# Altium schematic symbol library jlcpcb_2025_04_capacitors_extended_0603.schlib: 3668 symbols (part 1 of 20) (continued)
## 0603B201K500NT
designator C?  Capacitance: 200pF  (hidden comment: *)
Capacitor, Ceramic (MLCC), 200pF, ±10%, 50V, X7R, ±10%, SMD 0603; Manufacturer: FH(Guangdong Fenghua Advanced Tech); Manufacturer Part Number: 0603B201K500NT; Package Size: 0603; JLCPCB Basic Part: No; JLCPCB Part Number: C1600; Supplier 1: LCSC; Category: Capacitors - MLCC; Supplier Part Number 1: C1600; Tolerance: ±10%; Voltage Rating: 50V; Temperature Coefficient: X7R; RoHS: Yes; ComponentLink1Description: Datasheet; ComponentLink1URL: https://wmsc.lcsc.com/wmsc/upload/file/pdf/v2/lcsc/2304140030_FH--Guangdong-Fenghua-Advanced-Tech-0603B201K500NT_C1600.pdf; ComponentLink2Description: JLCPCB Part URL; ComponentLink2URL: https://jlcpcb.com/partdetail/C1600; ComponentLink3Description: LCSC Part URL; ComponentLink3URL: https://lcsc.com/product-detail/Multilayer-Ceramic-Capacitors-MLCC---SMD-SMT_FH-Guangdong-Fenghua-Advanced-Tech-FH-Guangdong-Fenghua-Advanced-Tech-0603B201K500NT_C1600.html
footprint CAP-0603 (0603 (1608M) Capacitor)
pins: 1, 2

## 0603B202K500CT
designator C?  Capacitance: 2nF  (hidden comment: *)
Capacitor, Ceramic (MLCC), 2nF, ±10%, 50V, X7R, ±10%, SMD 0603; Manufacturer: Walsin Tech Corp; Manufacturer Part Number: 0603B202K500CT; Package Size: 0603; JLCPCB Basic Part: No; JLCPCB Part Number: C123505; Supplier 1: LCSC; Category: Capacitors - MLCC; Supplier Part Number 1: C123505; Tolerance: ±10%; Voltage Rating: 50V; Temperature Coefficient: X7R; RoHS: Yes; ComponentLink1Description: Datasheet; ComponentLink1URL: https://wmsc.lcsc.com/wmsc/upload/file/pdf/v2/lcsc/2304140030_Walsin-Tech-Corp-0603B202K500CT_C123505.pdf; ComponentLink2Description: JLCPCB Part URL; ComponentLink2URL: https://jlcpcb.com/partdetail/C123505; ComponentLink3Description: LCSC Part URL; ComponentLink3URL: https://lcsc.com/product-detail/Multilayer-Ceramic-Capacitors-MLCC---SMD-SMT_Walsin-Tech-Corp-Walsin-Tech-Corp-0603B202K500CT_C123505.html
footprint CAP-0603 (0603 (1608M) Capacitor)
pins: 1, 2

## 0603B202K500NT
designator C?  Capacitance: 2nF  (hidden comment: *)
Capacitor, Ceramic (MLCC), 2nF, ±10%, 50V, X7R, ±10%, SMD 0603; Manufacturer: FH(Guangdong Fenghua Advanced Tech); Manufacturer Part Number: 0603B202K500NT; Package Size: 0603; JLCPCB Basic Part: No; JLCPCB Part Number: C1601; Supplier 1: LCSC; Category: Capacitors - MLCC; Supplier Part Number 1: C1601; Tolerance: ±10%; Voltage Rating: 50V; Temperature Coefficient: X7R; RoHS: Yes; ComponentLink1Description: Datasheet; ComponentLink1URL: https://wmsc.lcsc.com/wmsc/upload/file/pdf/v2/lcsc/2304140030_FH--Guangdong-Fenghua-Advanced-Tech-0603B202K500NT_C1601.pdf; ComponentLink2Description: JLCPCB Part URL; ComponentLink2URL: https://jlcpcb.com/partdetail/C1601; ComponentLink3Description: LCSC Part URL; ComponentLink3URL: https://lcsc.com/product-detail/Multilayer-Ceramic-Capacitors-MLCC---SMD-SMT_FH-Guangdong-Fenghua-Advanced-Tech-FH-Guangdong-Fenghua-Advanced-Tech-0603B202K500NT_C1601.html
footprint CAP-0603 (0603 (1608M) Capacitor)
pins: 1, 2

## 0603B203K500CT
designator C?  Capacitance: 20nF  (hidden comment: *)
Capacitor, Ceramic (MLCC), 20nF, ±10%, 50V, X7R, ±10%, SMD 0603; Manufacturer: Walsin Tech Corp; Manufacturer Part Number: 0603B203K500CT; Package Size: 0603; JLCPCB Basic Part: No; JLCPCB Part Number: C296019; Supplier 1: LCSC; Category: Capacitors - MLCC; Supplier Part Number 1: C296019; Tolerance: ±10%; Voltage Rating: 50V; Temperature Coefficient: X7R; RoHS: Yes; ComponentLink1Description: Datasheet; ComponentLink1URL: https://wmsc.lcsc.com/wmsc/upload/file/pdf/v2/lcsc/2304140030_Walsin-Tech-Corp-0603B203K500CT_C296019.pdf; ComponentLink2Description: JLCPCB Part URL; ComponentLink2URL: https://jlcpcb.com/partdetail/C296019; ComponentLink3Description: LCSC Part URL; ComponentLink3URL: https://lcsc.com/product-detail/Multilayer-Ceramic-Capacitors-MLCC---SMD-SMT_Walsin-Tech-Corp-Walsin-Tech-Corp-0603B203K500CT_C296019.html
footprint CAP-0603 (0603 (1608M) Capacitor)
pins: 1, 2

## 0603B203K500NT
designator C?  Capacitance: 20nF  (hidden comment: *)
Capacitor, Ceramic (MLCC), 20nF, ±10%, 50V, X7R, ±10%, SMD 0603; Manufacturer: FH(Guangdong Fenghua Advanced Tech); Manufacturer Part Number: 0603B203K500NT; Package Size: 0603; JLCPCB Basic Part: No; JLCPCB Part Number: C1602; Supplier 1: LCSC; Category: Capacitors - MLCC; Supplier Part Number 1: C1602; Tolerance: ±10%; Voltage Rating: 50V; Temperature Coefficient: X7R; RoHS: Yes; ComponentLink1Description: Datasheet; ComponentLink1URL: https://wmsc.lcsc.com/wmsc/upload/file/pdf/v2/lcsc/2304140030_FH--Guangdong-Fenghua-Advanced-Tech-0603B203K500NT_C1602.pdf; ComponentLink2Description: JLCPCB Part URL; ComponentLink2URL: https://jlcpcb.com/partdetail/C1602; ComponentLink3Description: LCSC Part URL; ComponentLink3URL: https://lcsc.com/product-detail/Multilayer-Ceramic-Capacitors-MLCC---SMD-SMT_FH-Guangdong-Fenghua-Advanced-Tech-FH-Guangdong-Fenghua-Advanced-Tech-0603B203K500NT_C1602.html
footprint CAP-0603 (0603 (1608M) Capacitor)
pins: 1, 2

## 0603B221J500CT
designator C?  Capacitance: 220pF  (hidden comment: *)
Capacitor, Ceramic (MLCC), 220pF, ±5%, 50V, X7R, ±5%, SMD 0603; Manufacturer: Walsin Tech Corp; Manufacturer Part Number: 0603B221J500CT; Package Size: 0603; JLCPCB Basic Part: No; JLCPCB Part Number: C525500; Supplier 1: LCSC; Category: Capacitors - MLCC; Supplier Part Number 1: C525500; Tolerance: ±5%; Voltage Rating: 50V; Temperature Coefficient: X7R; RoHS: Yes; ComponentLink1Description: Datasheet; ComponentLink1URL: https://wmsc.lcsc.com/wmsc/upload/file/pdf/v2/lcsc/2304140030_Walsin-Tech-Corp-0603B221J500CT_C525500.pdf; ComponentLink2Description: JLCPCB Part URL; ComponentLink2URL: https://jlcpcb.com/partdetail/C525500; ComponentLink3Description: LCSC Part URL; ComponentLink3URL: https://lcsc.com/product-detail/Multilayer-Ceramic-Capacitors-MLCC---SMD-SMT_Walsin-Tech-Corp-Walsin-Tech-Corp-0603B221J500CT_C525500.html
footprint CAP-0603 (0603 (1608M) Capacitor)
pins: 1, 2

## 0603B221K101NT
designator C?  Capacitance: 220pF  (hidden comment: *)
Capacitor, Ceramic (MLCC), 220pF, ±10%, 100V, X7R, ±10%, SMD 0603; Manufacturer: FH(Guangdong Fenghua Advanced Tech); Manufacturer Part Number: 0603B221K101NT; Package Size: 0603; JLCPCB Basic Part: No; JLCPCB Part Number: C313082; Supplier 1: LCSC; Category: Capacitors - MLCC; Supplier Part Number 1: C313082; Tolerance: ±10%; Voltage Rating: 100V; Temperature Coefficient: X7R; RoHS: Yes; ComponentLink1Description: Datasheet; ComponentLink1URL: https://wmsc.lcsc.com/wmsc/upload/file/pdf/v2/lcsc/2304140030_FH--Guangdong-Fenghua-Advanced-Tech-0603B221K101NT_C313082.pdf; ComponentLink2Description: JLCPCB Part URL; ComponentLink2URL: https://jlcpcb.com/partdetail/C313082; ComponentLink3Description: LCSC Part URL; ComponentLink3URL: https://lcsc.com/product-detail/Multilayer-Ceramic-Capacitors-MLCC---SMD-SMT_FH-Guangdong-Fenghua-Advanced-Tech-FH-Guangdong-Fenghua-Advanced-Tech-0603B221K101NT_C313082.html
footprint CAP-0603 (0603 (1608M) Capacitor)
pins: 1, 2

## 0603B221K201CT
designator C?  Capacitance: 220pF  (hidden comment: *)
Capacitor, Ceramic (MLCC), 220pF, ±10%, 200V, X7R, ±10%, SMD 0603; Manufacturer: Walsin Tech Corp; Manufacturer Part Number: 0603B221K201CT; Package Size: 0603; JLCPCB Basic Part: No; JLCPCB Part Number: C396708; Supplier 1: LCSC; Category: Capacitors - MLCC; Supplier Part Number 1: C396708; Tolerance: ±10%; Voltage Rating: 200V; Temperature Coefficient: X7R; RoHS: Yes; ComponentLink1Description: Datasheet; ComponentLink1URL: https://wmsc.lcsc.com/wmsc/upload/file/pdf/v2/lcsc/2304140030_Walsin-Tech-Corp-0603B221K201CT_C396708.pdf; ComponentLink2Description: JLCPCB Part URL; ComponentLink2URL: https://jlcpcb.com/partdetail/C396708; ComponentLink3Description: LCSC Part URL; ComponentLink3URL: https://lcsc.com/product-detail/Multilayer-Ceramic-Capacitors-MLCC---SMD-SMT_Walsin-Tech-Corp-Walsin-Tech-Corp-0603B221K201CT_C396708.html
footprint CAP-0603 (0603 (1608M) Capacitor)
pins: 1, 2

## 0603B221K201NT
designator C?  Capacitance: 220pF  (hidden comment: *)
Capacitor, Ceramic (MLCC), 220pF, ±10%, 200V, X7R, ±10%, SMD 0603; Manufacturer: FH(Guangdong Fenghua Advanced Tech); Manufacturer Part Number: 0603B221K201NT; Package Size: 0603; JLCPCB Basic Part: No; JLCPCB Part Number: C575440; Supplier 1: LCSC; Category: Capacitors - MLCC; Supplier Part Number 1: C575440; Tolerance: ±10%; Voltage Rating: 200V; Temperature Coefficient: X7R; RoHS: Yes; ComponentLink1Description: Datasheet; ComponentLink1URL: https://wmsc.lcsc.com/wmsc/upload/file/pdf/v2/lcsc/2304140030_FH--Guangdong-Fenghua-Advanced-Tech-0603B221K201NT_C575440.pdf; ComponentLink2Description: JLCPCB Part URL; ComponentLink2URL: https://jlcpcb.com/partdetail/C575440; ComponentLink3Description: LCSC Part URL; ComponentLink3URL: https://lcsc.com/product-detail/Multilayer-Ceramic-Capacitors-MLCC---SMD-SMT_FH-Guangdong-Fenghua-Advanced-Tech-FH-Guangdong-Fenghua-Advanced-Tech-0603B221K201NT_C575440.html
footprint CAP-0603 (0603 (1608M) Capacitor)
pins: 1, 2

## 0603B221K251CT
designator C?  Capacitance: 220pF  (hidden comment: *)
Capacitor, Ceramic (MLCC), 220pF, ±10%, 250V, X7R, ±10%, SMD 0603; Manufacturer: Walsin Tech Corp; Manufacturer Part Number: 0603B221K251CT; Package Size: 0603; JLCPCB Basic Part: No; JLCPCB Part Number: C2962048; Supplier 1: LCSC; Category: Capacitors - MLCC; Supplier Part Number 1: C2962048; Tolerance: ±10%; Voltage Rating: 250V; Temperature Coefficient: X7R; RoHS: Yes; ComponentLink1Description: Datasheet; ComponentLink1URL: https://wmsc.lcsc.com/wmsc/upload/file/pdf/v2/lcsc/2201181800_Walsin-Tech-Corp-0603B221K251CT_C2962048.pdf; ComponentLink2Description: JLCPCB Part URL; ComponentLink2URL: https://jlcpcb.com/partdetail/C2962048; ComponentLink3Description: LCSC Part URL; ComponentLink3URL: https://lcsc.com/product-detail/Multilayer-Ceramic-Capacitors-MLCC---SMD-SMT_Walsin-Tech-Corp-Walsin-Tech-Corp-0603B221K251CT_C2962048.html
footprint CAP-0603 (0603 (1608M) Capacitor)
pins: 1, 2

## 0603B221K251NT
designator C?  Capacitance: 220pF  (hidden comment: *)
Capacitor, Ceramic (MLCC), 220pF, ±10%, 250V, X7R, ±10%, SMD 0603; Manufacturer: FH (Guangdong Fenghua Advanced Tech); Manufacturer Part Number: 0603B221K251NT; Package Size: 0603; JLCPCB Basic Part: No; JLCPCB Part Number: C5350801; Supplier 1: LCSC; Category: Capacitors - MLCC; Supplier Part Number 1: C5350801; Tolerance: ±10%; Voltage Rating: 250V; Temperature Coefficient: X7R; RoHS: Yes; ComponentLink1Description: Datasheet; ComponentLink1URL: https://wmsc.lcsc.com/wmsc/upload/file/pdf/v2/lcsc/2301131609_FH--Guangdong-Fenghua-Advanced-Tech-0603B221K251NT_C5350801.pdf; ComponentLink2Description: JLCPCB Part URL; ComponentLink2URL: https://jlcpcb.com/partdetail/C5350801; ComponentLink3Description: LCSC Part URL; ComponentLink3URL: https://lcsc.com/product-detail/Multilayer-Ceramic-Capacitors-MLCC---SMD-SMT_FH-Guangdong-Fenghua-Advanced-Tech-FH-Guangdong-Fenghua-Advanced-Tech-0603B221K251NT_C5350801.html
footprint CAP-0603 (0603 (1608M) Capacitor)
pins: 1, 2

## 0603B221K500CT
designator C?  Capacitance: 220pF  (hidden comment: *)
Capacitor, Ceramic (MLCC), 220pF, ±10%, 50V, X7R, ±10%, SMD 0603; Manufacturer: Walsin Tech Corp; Manufacturer Part Number: 0603B221K500CT; Package Size: 0603; JLCPCB Basic Part: No; JLCPCB Part Number: C123506; Supplier 1: LCSC; Category: Capacitors - MLCC; Supplier Part Number 1: C123506; Tolerance: ±10%; Voltage Rating: 50V; Temperature Coefficient: X7R; RoHS: Yes; ComponentLink1Description: Datasheet; ComponentLink1URL: https://wmsc.lcsc.com/wmsc/upload/file/pdf/v2/lcsc/2304140030_Walsin-Tech-Corp-0603B221K500CT_C123506.pdf; ComponentLink2Description: JLCPCB Part URL; ComponentLink2URL: https://jlcpcb.com/partdetail/C123506; ComponentLink3Description: LCSC Part URL; ComponentLink3URL: https://lcsc.com/product-detail/Multilayer-Ceramic-Capacitors-MLCC---SMD-SMT_Walsin-Tech-Corp-Walsin-Tech-Corp-0603B221K500CT_C123506.html
footprint CAP-0603 (0603 (1608M) Capacitor)
pins: 1, 2

## 0603B221K500NT
designator C?  Capacitance: 220pF  (hidden comment: *)
Capacitor, Ceramic (MLCC), 220pF, ±10%, 50V, X7R, ±10%, SMD 0603; Manufacturer: FH(Guangdong Fenghua Advanced Tech); Manufacturer Part Number: 0603B221K500NT; Package Size: 0603; JLCPCB Basic Part: No; JLCPCB Part Number: C36259; Supplier 1: LCSC; Category: Capacitors - MLCC; Supplier Part Number 1: C36259; Tolerance: ±10%; Voltage Rating: 50V; Temperature Coefficient: X7R; RoHS: Yes; ComponentLink1Description: Datasheet; ComponentLink1URL: https://wmsc.lcsc.com/wmsc/upload/file/pdf/v2/lcsc/2304140030_FH--Guangdong-Fenghua-Advanced-Tech-0603B221K500NT_C36259.pdf; ComponentLink2Description: JLCPCB Part URL; ComponentLink2URL: https://jlcpcb.com/partdetail/C36259; ComponentLink3Description: LCSC Part URL; ComponentLink3URL: https://lcsc.com/product-detail/Multilayer-Ceramic-Capacitors-MLCC---SMD-SMT_FH-Guangdong-Fenghua-Advanced-Tech-FH-Guangdong-Fenghua-Advanced-Tech-0603B221K500NT_C36259.html
footprint CAP-0603 (0603 (1608M) Capacitor)
pins: 1, 2

## 0603B221M101CT
designator C?  Capacitance: 220pF  (hidden comment: *)
Capacitor, Ceramic (MLCC), 220pF, ±20%, 100V, X7R, ±20%, SMD 0603; Manufacturer: Walsin Tech Corp; Manufacturer Part Number: 0603B221M101CT; Package Size: 0603; JLCPCB Basic Part: No; JLCPCB Part Number: C384787; Supplier 1: LCSC; Category: Capacitors - MLCC; Supplier Part Number 1: C384787; Tolerance: ±20%; Voltage Rating: 100V; Temperature Coefficient: X7R; RoHS: Yes; ComponentLink1Description: Datasheet; ComponentLink1URL: https://wmsc.lcsc.com/wmsc/upload/file/pdf/v2/lcsc/2304140030_Walsin-Tech-Corp-0603B221M101CT_C384787.pdf; ComponentLink2Description: JLCPCB Part URL; ComponentLink2URL: https://jlcpcb.com/partdetail/C384787; ComponentLink3Description: LCSC Part URL; ComponentLink3URL: https://lcsc.com/product-detail/Multilayer-Ceramic-Capacitors-MLCC---SMD-SMT_Walsin-Tech-Corp-Walsin-Tech-Corp-0603B221M101CT_C384787.html
footprint CAP-0603 (0603 (1608M) Capacitor)
pins: 1, 2

## 0603B222J250CT
designator C?  Capacitance: 2.2nF  (hidden comment: *)
Capacitor, Ceramic (MLCC), 2.2nF, ±5%, 25V, X7R, ±5%, SMD 0603; Manufacturer: Walsin Tech Corp; Manufacturer Part Number: 0603B222J250CT; Package Size: 0603; JLCPCB Basic Part: No; JLCPCB Part Number: C388008; Supplier 1: LCSC; Category: Capacitors - MLCC; Supplier Part Number 1: C388008; Tolerance: ±5%; Voltage Rating: 25V; Temperature Coefficient: X7R; RoHS: Yes; ComponentLink1Description: Datasheet; ComponentLink1URL: https://wmsc.lcsc.com/wmsc/upload/file/pdf/v2/lcsc/2304140030_Walsin-Tech-Corp-0603B222J250CT_C388008.pdf; ComponentLink2Description: JLCPCB Part URL; ComponentLink2URL: https://jlcpcb.com/partdetail/C388008; ComponentLink3Description: LCSC Part URL; ComponentLink3URL: https://lcsc.com/product-detail/Multilayer-Ceramic-Capacitors-MLCC---SMD-SMT_Walsin-Tech-Corp-Walsin-Tech-Corp-0603B222J250CT_C388008.html
footprint CAP-0603 (0603 (1608M) Capacitor)
pins: 1, 2

## 0603B222J500CT
designator C?  Capacitance: 2.2nF  (hidden comment: *)
Capacitor, Ceramic (MLCC), 2.2nF, ±5%, 50V, X7R, ±5%, SMD 0603; Manufacturer: Walsin Tech Corp; Manufacturer Part Number: 0603B222J500CT; Package Size: 0603; JLCPCB Basic Part: No; JLCPCB Part Number: C296020; Supplier 1: LCSC; Category: Capacitors - MLCC; Supplier Part Number 1: C296020; Tolerance: ±5%; Voltage Rating: 50V; Temperature Coefficient: X7R; RoHS: Yes; ComponentLink1Description: Datasheet; ComponentLink1URL: https://wmsc.lcsc.com/wmsc/upload/file/pdf/v2/lcsc/2304140030_Walsin-Tech-Corp-0603B222J500CT_C296020.pdf; ComponentLink2Description: JLCPCB Part URL; ComponentLink2URL: https://jlcpcb.com/partdetail/C296020; ComponentLink3Description: LCSC Part URL; ComponentLink3URL: https://lcsc.com/product-detail/Multilayer-Ceramic-Capacitors-MLCC---SMD-SMT_Walsin-Tech-Corp-Walsin-Tech-Corp-0603B222J500CT_C296020.html
footprint CAP-0603 (0603 (1608M) Capacitor)
pins: 1, 2

## 0603B222J500NT
designator C?  Capacitance: 2.2nF  (hidden comment: *)
Capacitor, Ceramic (MLCC), 2.2nF, ±5%, 50V, X7R, ±5%, SMD 0603; Manufacturer: FH(Guangdong Fenghua Advanced Tech); Manufacturer Part Number: 0603B222J500NT; Package Size: 0603; JLCPCB Basic Part: No; JLCPCB Part Number: C60328; Supplier 1: LCSC; Category: Capacitors - MLCC; Supplier Part Number 1: C60328; Tolerance: ±5%; Voltage Rating: 50V; Temperature Coefficient: X7R; RoHS: Yes; ComponentLink1Description: Datasheet; ComponentLink1URL: https://wmsc.lcsc.com/wmsc/upload/file/pdf/v2/lcsc/2304140030_FH--Guangdong-Fenghua-Advanced-Tech-0603B222J500NT_C60328.pdf; ComponentLink2Description: JLCPCB Part URL; ComponentLink2URL: https://jlcpcb.com/partdetail/C60328; ComponentLink3Description: LCSC Part URL; ComponentLink3URL: https://lcsc.com/product-detail/Multilayer-Ceramic-Capacitors-MLCC---SMD-SMT_FH-Guangdong-Fenghua-Advanced-Tech-FH-Guangdong-Fenghua-Advanced-Tech-0603B222J500NT_C60328.html
footprint CAP-0603 (0603 (1608M) Capacitor)
pins: 1, 2

## 0603B222K101CT
designator C?  Capacitance: 2.2nF  (hidden comment: *)
Capacitor, Ceramic (MLCC), 2.2nF, ±10%, 100V, X7R, ±10%, SMD 0603; Manufacturer: Walsin Tech Corp; Manufacturer Part Number: 0603B222K101CT; Package Size: 0603; JLCPCB Basic Part: No; JLCPCB Part Number: C302019; Supplier 1: LCSC; Category: Capacitors - MLCC; Supplier Part Number 1: C302019; Tolerance: ±10%; Voltage Rating: 100V; Temperature Coefficient: X7R; RoHS: Yes; ComponentLink1Description: Datasheet; ComponentLink1URL: https://wmsc.lcsc.com/wmsc/upload/file/pdf/v2/lcsc/2304140030_Walsin-Tech-Corp-0603B222K101CT_C302019.pdf; ComponentLink2Description: JLCPCB Part URL; ComponentLink2URL: https://jlcpcb.com/partdetail/C302019; ComponentLink3Description: LCSC Part URL; ComponentLink3URL: https://lcsc.com/product-detail/Multilayer-Ceramic-Capacitors-MLCC---SMD-SMT_Walsin-Tech-Corp-Walsin-Tech-Corp-0603B222K101CT_C302019.html
footprint CAP-0603 (0603 (1608M) Capacitor)
pins: 1, 2

## 0603B222K101NT
designator C?  Capacitance: 2200pF  (hidden comment: *)
Capacitor, Ceramic (MLCC), 2200pF, ±10%, 100V, X7R, ±10%, SMD 0603; Manufacturer: FH (Guangdong Fenghua Advanced Tech); Manufacturer Part Number: 0603B222K101NT; Package Size: 0603; JLCPCB Basic Part: No; JLCPCB Part Number: C913915; Supplier 1: LCSC; Category: Capacitors - MLCC; Supplier Part Number 1: C913915; Tolerance: ±10%; Voltage Rating: 100V; Temperature Coefficient: X7R; RoHS: Yes; ComponentLink1Description: Datasheet; ComponentLink1URL: https://wmsc.lcsc.com/wmsc/upload/file/pdf/v2/lcsc/2304140030_FH--Guangdong-Fenghua-Advanced-Tech-0603B222K101NT_C913915.pdf; ComponentLink2Description: JLCPCB Part URL; ComponentLink2URL: https://jlcpcb.com/partdetail/C913915; ComponentLink3Description: LCSC Part URL; ComponentLink3URL: https://lcsc.com/product-detail/Multilayer-Ceramic-Capacitors-MLCC---SMD-SMT_FH-Guangdong-Fenghua-Advanced-Tech-FH-Guangdong-Fenghua-Advanced-Tech-0603B222K101NT_C913915.html
footprint CAP-0603 (0603 (1608M) Capacitor)
pins: 1, 2

## 0603B222K250NT
designator C?  Capacitance: 2.2nF  (hidden comment: *)
Capacitor, Ceramic (MLCC), 2.2nF, ±10%, 25V, X7R, ±10%, SMD 0603; Manufacturer: FH (Guangdong Fenghua Advanced Tech); Manufacturer Part Number: 0603B222K250NT; Package Size: 0603; JLCPCB Basic Part: No; JLCPCB Part Number: C2971754; Supplier 1: LCSC; Category: Capacitors - MLCC; Supplier Part Number 1: C2971754; Tolerance: ±10%; Voltage Rating: 25V; Temperature Coefficient: X7R; RoHS: Yes; ComponentLink1Description: Datasheet; ComponentLink1URL: https://wmsc.lcsc.com/wmsc/upload/file/pdf/v2/lcsc/2201241400_FH--Guangdong-Fenghua-Advanced-Tech-0603B222K250NT_C2971754.pdf; ComponentLink2Description: JLCPCB Part URL; ComponentLink2URL: https://jlcpcb.com/partdetail/C2971754; ComponentLink3Description: LCSC Part URL; ComponentLink3URL: https://lcsc.com/product-detail/Multilayer-Ceramic-Capacitors-MLCC---SMD-SMT_FH-Guangdong-Fenghua-Advanced-Tech-FH-Guangdong-Fenghua-Advanced-Tech-0603B222K250NT_C2971754.html
footprint CAP-0603 (0603 (1608M) Capacitor)
pins: 1, 2

## 0603B222K500CT
designator C?  Capacitance: 2.2nF  (hidden comment: *)
Capacitor, Ceramic (MLCC), 2.2nF, ±10%, 50V, X7R, ±10%, SMD 0603; Manufacturer: Walsin Tech Corp; Manufacturer Part Number: 0603B222K500CT; Package Size: 0603; JLCPCB Basic Part: No; JLCPCB Part Number: C93190; Supplier 1: LCSC; Category: Capacitors - MLCC; Supplier Part Number 1: C93190; Tolerance: ±10%; Voltage Rating: 50V; Temperature Coefficient: X7R; RoHS: Yes; ComponentLink1Description: Datasheet; ComponentLink1URL: https://wmsc.lcsc.com/wmsc/upload/file/pdf/v2/lcsc/2304140030_Walsin-Tech-Corp-0603B222K500CT_C93190.pdf; ComponentLink2Description: JLCPCB Part URL; ComponentLink2URL: https://jlcpcb.com/partdetail/C93190; ComponentLink3Description: LCSC Part URL; ComponentLink3URL: https://lcsc.com/product-detail/Multilayer-Ceramic-Capacitors-MLCC---SMD-SMT_Walsin-Tech-Corp-Walsin-Tech-Corp-0603B222K500CT_C93190.html
footprint CAP-0603 (0603 (1608M) Capacitor)
pins: 1, 2

## 0603B222K500CT-C
designator C?  Capacitance: 2.2nF  (hidden comment: *)
Capacitor, Ceramic (MLCC), 2.2nF, 50V, X7R, SMD 0603; Manufacturer: Walsin Tech Corp; Manufacturer Part Number: 0603B222K500CT-C; Package Size: 0603; JLCPCB Basic Part: No; JLCPCB Part Number: C2991477; Supplier 1: LCSC; Category: Capacitors - MLCC; Supplier Part Number 1: C2991477; Voltage Rating: 50V; Temperature Coefficient: X7R; RoHS: Yes; ComponentLink1Description: Datasheet; ComponentLink1URL: https://wmsc.lcsc.com/wmsc/upload/file/pdf/v2/lcsc/2204131745_Walsin-Tech-Corp-0603B222K500CT-C_C2991477.pdf; ComponentLink2Description: JLCPCB Part URL; ComponentLink2URL: https://jlcpcb.com/partdetail/C2991477; ComponentLink3Description: LCSC Part URL; ComponentLink3URL: https://lcsc.com/product-detail/Multilayer-Ceramic-Capacitors-MLCC---SMD-SMT_Walsin-Tech-Corp-Walsin-Tech-Corp-0603B222K500CT-C_C2991477.html
footprint CAP-0603 (0603 (1608M) Capacitor)
pins: 1, 2

## 0603B223J250NT
designator C?  Capacitance: 22nF  (hidden comment: *)
Capacitor, Ceramic (MLCC), 22nF, ±5%, 25V, X7R, ±5%, SMD 0603; Manufacturer: FH (Guangdong Fenghua Advanced Tech); Manufacturer Part Number: 0603B223J250NT; Package Size: 0603; JLCPCB Basic Part: No; JLCPCB Part Number: C302020; Supplier 1: LCSC; Category: Capacitors - MLCC; Supplier Part Number 1: C302020; Tolerance: ±5%; Voltage Rating: 25V; Temperature Coefficient: X7R; RoHS: Yes; ComponentLink1Description: Datasheet; ComponentLink1URL: https://wmsc.lcsc.com/wmsc/upload/file/pdf/v2/lcsc/2304140030_FH--Guangdong-Fenghua-Advanced-Tech-0603B223J250NT_C302020.pdf; ComponentLink2Description: JLCPCB Part URL; ComponentLink2URL: https://jlcpcb.com/partdetail/C302020; ComponentLink3Description: LCSC Part URL; ComponentLink3URL: https://lcsc.com/product-detail/Multilayer-Ceramic-Capacitors-MLCC---SMD-SMT_FH-Guangdong-Fenghua-Advanced-Tech-FH-Guangdong-Fenghua-Advanced-Tech-0603B223J250NT_C302020.html
footprint CAP-0603 (0603 (1608M) Capacitor)
pins: 1, 2

## 0603B223J500CT
designator C?  Capacitance: 22nF  (hidden comment: *)
Capacitor, Ceramic (MLCC), 22nF, ±5%, 50V, X7R, ±5%, SMD 0603; Manufacturer: Walsin Tech Corp; Manufacturer Part Number: 0603B223J500CT; Package Size: 0603; JLCPCB Basic Part: No; JLCPCB Part Number: C388009; Supplier 1: LCSC; Category: Capacitors - MLCC; Supplier Part Number 1: C388009; Tolerance: ±5%; Voltage Rating: 50V; Temperature Coefficient: X7R; RoHS: Yes; ComponentLink1Description: Datasheet; ComponentLink1URL: https://wmsc.lcsc.com/wmsc/upload/file/pdf/v2/lcsc/2304140030_Walsin-Tech-Corp-0603B223J500CT_C388009.pdf; ComponentLink2Description: JLCPCB Part URL; ComponentLink2URL: https://jlcpcb.com/partdetail/C388009; ComponentLink3Description: LCSC Part URL; ComponentLink3URL: https://lcsc.com/product-detail/Multilayer-Ceramic-Capacitors-MLCC---SMD-SMT_Walsin-Tech-Corp-Walsin-Tech-Corp-0603B223J500CT_C388009.html
footprint CAP-0603 (0603 (1608M) Capacitor)
pins: 1, 2

## 0603B223J500NT
designator C?  Capacitance: 22nF  (hidden comment: *)
Capacitor, Ceramic (MLCC), 22nF, ±5%, 50V, X7R, ±5%, SMD 0603; Manufacturer: FH(Guangdong Fenghua Advanced Tech); Manufacturer Part Number: 0603B223J500NT; Package Size: 0603; JLCPCB Basic Part: No; JLCPCB Part Number: C67702; Supplier 1: LCSC; Category: Capacitors - MLCC; Supplier Part Number 1: C67702; Tolerance: ±5%; Voltage Rating: 50V; Temperature Coefficient: X7R; RoHS: Yes; ComponentLink1Description: Datasheet; ComponentLink1URL: https://wmsc.lcsc.com/wmsc/upload/file/pdf/v2/lcsc/2304140030_FH--Guangdong-Fenghua-Advanced-Tech-0603B223J500NT_C67702.pdf; ComponentLink2Description: JLCPCB Part URL; ComponentLink2URL: https://jlcpcb.com/partdetail/C67702; ComponentLink3Description: LCSC Part URL; ComponentLink3URL: https://lcsc.com/product-detail/Multilayer-Ceramic-Capacitors-MLCC---SMD-SMT_FH-Guangdong-Fenghua-Advanced-Tech-FH-Guangdong-Fenghua-Advanced-Tech-0603B223J500NT_C67702.html
footprint CAP-0603 (0603 (1608M) Capacitor)
pins: 1, 2

## 0603B223K101CT
designator C?  Capacitance: 22nF  (hidden comment: *)
Capacitor, Ceramic (MLCC), 22nF, ±10%, 100V, X7R, ±10%, SMD 0603; Manufacturer: Walsin Tech Corp; Manufacturer Part Number: 0603B223K101CT; Package Size: 0603; JLCPCB Basic Part: No; JLCPCB Part Number: C388010; Supplier 1: LCSC; Category: Capacitors - MLCC; Supplier Part Number 1: C388010; Tolerance: ±10%; Voltage Rating: 100V; Temperature Coefficient: X7R; RoHS: Yes; ComponentLink1Description: Datasheet; ComponentLink1URL: https://wmsc.lcsc.com/wmsc/upload/file/pdf/v2/lcsc/2304140030_Walsin-Tech-Corp-0603B223K101CT_C388010.pdf; ComponentLink2Description: JLCPCB Part URL; ComponentLink2URL: https://jlcpcb.com/partdetail/C388010; ComponentLink3Description: LCSC Part URL; ComponentLink3URL: https://lcsc.com/product-detail/Multilayer-Ceramic-Capacitors-MLCC---SMD-SMT_Walsin-Tech-Corp-Walsin-Tech-Corp-0603B223K101CT_C388010.html
footprint CAP-0603 (0603 (1608M) Capacitor)
pins: 1, 2

## 0603B223K101NT
designator C?  Capacitance: 22nF  (hidden comment: *)
Capacitor, Ceramic (MLCC), 22nF, ±10%, 100V, X7R, ±10%, SMD 0603; Manufacturer: FH(Guangdong Fenghua Advanced Tech); Manufacturer Part Number: 0603B223K101NT; Package Size: 0603; JLCPCB Basic Part: No; JLCPCB Part Number: C313083; Supplier 1: LCSC; Category: Capacitors - MLCC; Supplier Part Number 1: C313083; Tolerance: ±10%; Voltage Rating: 100V; Temperature Coefficient: X7R; RoHS: Yes; ComponentLink1Description: Datasheet; ComponentLink1URL: https://wmsc.lcsc.com/wmsc/upload/file/pdf/v2/lcsc/2304140030_FH--Guangdong-Fenghua-Advanced-Tech-0603B223K101NT_C313083.pdf; ComponentLink2Description: JLCPCB Part URL; ComponentLink2URL: https://jlcpcb.com/partdetail/C313083; ComponentLink3Description: LCSC Part URL; ComponentLink3URL: https://lcsc.com/product-detail/Multilayer-Ceramic-Capacitors-MLCC---SMD-SMT_FH-Guangdong-Fenghua-Advanced-Tech-FH-Guangdong-Fenghua-Advanced-Tech-0603B223K101NT_C313083.html
footprint CAP-0603 (0603 (1608M) Capacitor)
pins: 1, 2

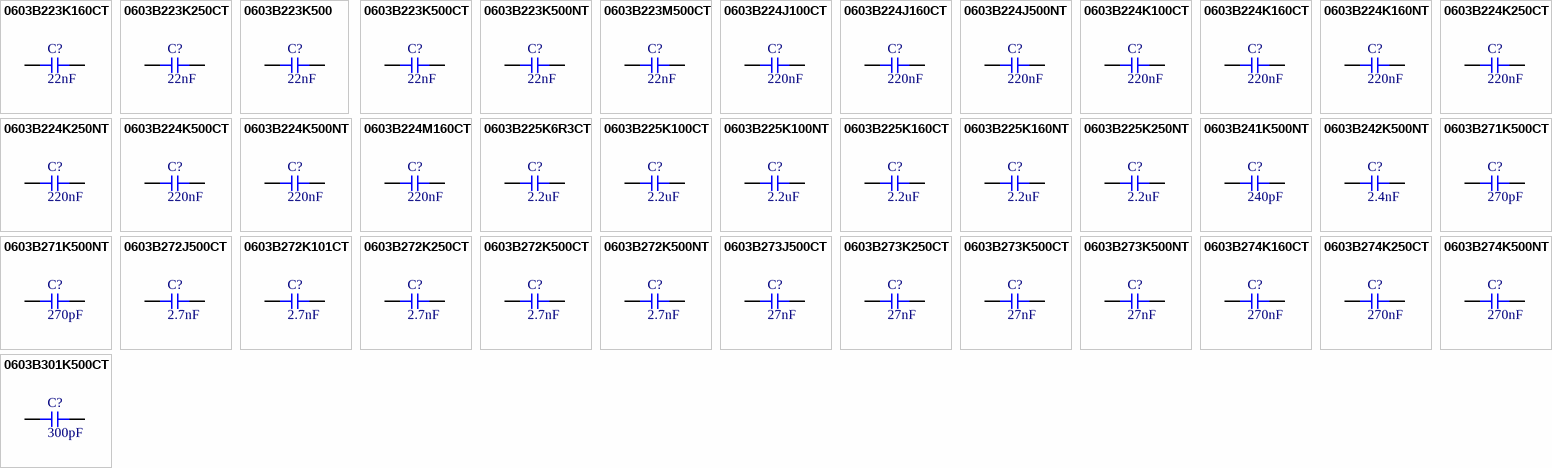
[diagram p4: symbols 0603B223K160CT to 0603B301K500CT]

## 0603B223K160CT
designator C?  Capacitance: 22nF  (hidden comment: *)
Capacitor, Ceramic (MLCC), 22nF, ±10%, 16V, X7R, ±10%, SMD 0603; Manufacturer: Walsin Tech Corp; Manufacturer Part Number: 0603B223K160CT; Package Size: 0603; JLCPCB Basic Part: No; JLCPCB Part Number: C384784; Supplier 1: LCSC; Category: Capacitors - MLCC; Supplier Part Number 1: C384784; Tolerance: ±10%; Voltage Rating: 16V; Temperature Coefficient: X7R; RoHS: Yes; ComponentLink1Description: Datasheet; ComponentLink1URL: https://wmsc.lcsc.com/wmsc/upload/file/pdf/v2/lcsc/2304140030_Walsin-Tech-Corp-0603B223K160CT_C384784.pdf; ComponentLink2Description: JLCPCB Part URL; ComponentLink2URL: https://jlcpcb.com/partdetail/C384784; ComponentLink3Description: LCSC Part URL; ComponentLink3URL: https://lcsc.com/product-detail/Multilayer-Ceramic-Capacitors-MLCC---SMD-SMT_Walsin-Tech-Corp-Walsin-Tech-Corp-0603B223K160CT_C384784.html
footprint CAP-0603 (0603 (1608M) Capacitor)
pins: 1, 2

## 0603B223K250CT
designator C?  Capacitance: 22nF  (hidden comment: *)
Capacitor, Ceramic (MLCC), 22nF, ±10%, 25V, X7R, ±10%, SMD 0603; Manufacturer: Walsin Tech Corp; Manufacturer Part Number: 0603B223K250CT; Package Size: 0603; JLCPCB Basic Part: No; JLCPCB Part Number: C335545; Supplier 1: LCSC; Category: Capacitors - MLCC; Supplier Part Number 1: C335545; Tolerance: ±10%; Voltage Rating: 25V; Temperature Coefficient: X7R; RoHS: Yes; ComponentLink1Description: Datasheet; ComponentLink1URL: https://wmsc.lcsc.com/wmsc/upload/file/pdf/v2/lcsc/2202140030_Walsin-Tech-Corp-0603B223K250CT_C335545.pdf; ComponentLink2Description: JLCPCB Part URL; ComponentLink2URL: https://jlcpcb.com/partdetail/C335545; ComponentLink3Description: LCSC Part URL; ComponentLink3URL: https://lcsc.com/product-detail/Multilayer-Ceramic-Capacitors-MLCC---SMD-SMT_Walsin-Tech-Corp-Walsin-Tech-Corp-0603B223K250CT_C335545.html
footprint CAP-0603 (0603 (1608M) Capacitor)
pins: 1, 2

## 0603B223K500
designator C?  Capacitance: 22nF  (hidden comment: *)
Capacitor, Ceramic (MLCC), 22nF, ±10%, 50V, X7R, ±10%, SMD 0603; Manufacturer: Walsin Tech Corp; Manufacturer Part Number: 0603B223K500; Package Size: 0603; JLCPCB Basic Part: No; JLCPCB Part Number: C123507; Supplier 1: LCSC; Category: Capacitors - MLCC; Supplier Part Number 1: C123507; Tolerance: ±10%; Voltage Rating: 50V; Temperature Coefficient: X7R; RoHS: Yes; ComponentLink1Description: Datasheet; ComponentLink1URL: https://wmsc.lcsc.com/wmsc/upload/file/pdf/v2/lcsc/2304140030_Walsin-Tech-Corp-0603B223K500_C123507.pdf; ComponentLink2Description: JLCPCB Part URL; ComponentLink2URL: https://jlcpcb.com/partdetail/C123507; ComponentLink3Description: LCSC Part URL; ComponentLink3URL: https://lcsc.com/product-detail/Multilayer-Ceramic-Capacitors-MLCC---SMD-SMT_Walsin-Tech-Corp-Walsin-Tech-Corp-0603B223K500_C123507.html
footprint CAP-0603 (0603 (1608M) Capacitor)
pins: 1, 2

## 0603B223K500CT
designator C?  Capacitance: 22nF  (hidden comment: *)
Capacitor, Ceramic (MLCC), 22nF, ±10%, 50V, X7R, ±10%, SMD 0603; Manufacturer: Walsin Tech Corp; Manufacturer Part Number: 0603B223K500CT; Package Size: 0603; JLCPCB Basic Part: No; JLCPCB Part Number: C302021; Supplier 1: LCSC; Category: Capacitors - MLCC; Supplier Part Number 1: C302021; Tolerance: ±10%; Voltage Rating: 50V; Temperature Coefficient: X7R; RoHS: Yes; ComponentLink1Description: Datasheet; ComponentLink1URL: https://wmsc.lcsc.com/wmsc/upload/file/pdf/v2/lcsc/2304140030_Walsin-Tech-Corp-0603B223K500CT_C302021.pdf; ComponentLink2Description: JLCPCB Part URL; ComponentLink2URL: https://jlcpcb.com/partdetail/C302021; ComponentLink3Description: LCSC Part URL; ComponentLink3URL: https://lcsc.com/product-detail/Multilayer-Ceramic-Capacitors-MLCC---SMD-SMT_Walsin-Tech-Corp-Walsin-Tech-Corp-0603B223K500CT_C302021.html
footprint CAP-0603 (0603 (1608M) Capacitor)
pins: 1, 2

## 0603B223K500NT
designator C?  Capacitance: 22nF  (hidden comment: *)
Capacitor, Ceramic (MLCC), 22nF, ±10%, 50V, X7R, ±10%, SMD 0603; Manufacturer: FH(Guangdong Fenghua Advanced Tech); Manufacturer Part Number: 0603B223K500NT; Package Size: 0603; JLCPCB Basic Part: No; JLCPCB Part Number: C77571; Supplier 1: LCSC; Category: Capacitors - MLCC; Supplier Part Number 1: C77571; Tolerance: ±10%; Voltage Rating: 50V; Temperature Coefficient: X7R; RoHS: Yes; ComponentLink1Description: Datasheet; ComponentLink1URL: https://wmsc.lcsc.com/wmsc/upload/file/pdf/v2/lcsc/2304140030_FH--Guangdong-Fenghua-Advanced-Tech-0603B223K500NT_C77571.pdf; ComponentLink2Description: JLCPCB Part URL; ComponentLink2URL: https://jlcpcb.com/partdetail/C77571; ComponentLink3Description: LCSC Part URL; ComponentLink3URL: https://lcsc.com/product-detail/Multilayer-Ceramic-Capacitors-MLCC---SMD-SMT_FH-Guangdong-Fenghua-Advanced-Tech-FH-Guangdong-Fenghua-Advanced-Tech-0603B223K500NT_C77571.html
footprint CAP-0603 (0603 (1608M) Capacitor)
pins: 1, 2

## 0603B223M500CT
designator C?  Capacitance: 22nF  (hidden comment: *)
Capacitor, Ceramic (MLCC), 22nF, ±20%, 50V, X7R, ±20%, SMD 0603; Manufacturer: Walsin Tech Corp; Manufacturer Part Number: 0603B223M500CT; Package Size: 0603; JLCPCB Basic Part: No; JLCPCB Part Number: C296021; Supplier 1: LCSC; Category: Capacitors - MLCC; Supplier Part Number 1: C296021; Tolerance: ±20%; Voltage Rating: 50V; Temperature Coefficient: X7R; RoHS: Yes; ComponentLink1Description: Datasheet; ComponentLink1URL: https://wmsc.lcsc.com/wmsc/upload/file/pdf/v2/lcsc/2304140030_Walsin-Tech-Corp-0603B223M500CT_C296021.pdf; ComponentLink2Description: JLCPCB Part URL; ComponentLink2URL: https://jlcpcb.com/partdetail/C296021; ComponentLink3Description: LCSC Part URL; ComponentLink3URL: https://lcsc.com/product-detail/Multilayer-Ceramic-Capacitors-MLCC---SMD-SMT_Walsin-Tech-Corp-Walsin-Tech-Corp-0603B223M500CT_C296021.html
footprint CAP-0603 (0603 (1608M) Capacitor)
pins: 1, 2

## 0603B224J100CT
designator C?  Capacitance: 220nF  (hidden comment: *)
Capacitor, Ceramic (MLCC), 220nF, ±5%, 10V, X7R, ±5%, SMD 0603; Manufacturer: Walsin Tech Corp; Manufacturer Part Number: 0603B224J100CT; Package Size: 0603; JLCPCB Basic Part: No; JLCPCB Part Number: C388011; Supplier 1: LCSC; Category: Capacitors - MLCC; Supplier Part Number 1: C388011; Tolerance: ±5%; Voltage Rating: 10V; Temperature Coefficient: X7R; RoHS: Yes; ComponentLink1Description: Datasheet; ComponentLink1URL: https://wmsc.lcsc.com/wmsc/upload/file/pdf/v2/lcsc/2304140030_Walsin-Tech-Corp-0603B224J100CT_C388011.pdf; ComponentLink2Description: JLCPCB Part URL; ComponentLink2URL: https://jlcpcb.com/partdetail/C388011; ComponentLink3Description: LCSC Part URL; ComponentLink3URL: https://lcsc.com/product-detail/Multilayer-Ceramic-Capacitors-MLCC---SMD-SMT_Walsin-Tech-Corp-Walsin-Tech-Corp-0603B224J100CT_C388011.html
footprint CAP-0603 (0603 (1608M) Capacitor)
pins: 1, 2

## 0603B224J160CT
designator C?  Capacitance: 220nF  (hidden comment: *)
Capacitor, Ceramic (MLCC), 220nF, ±5%, 16V, X7R, ±5%, SMD 0603; Manufacturer: Walsin Tech Corp; Manufacturer Part Number: 0603B224J160CT; Package Size: 0603; JLCPCB Basic Part: No; JLCPCB Part Number: C3845088; Supplier 1: LCSC; Category: Capacitors - MLCC; Supplier Part Number 1: C3845088; Tolerance: ±5%; Voltage Rating: 16V; Temperature Coefficient: X7R; RoHS: Yes; ComponentLink1Description: Datasheet; ComponentLink1URL: https://wmsc.lcsc.com/wmsc/upload/file/pdf/v2/lcsc/2309201534_Walsin-Tech-Corp-0603B224J160CT_C3845088.pdf; ComponentLink2Description: JLCPCB Part URL; ComponentLink2URL: https://jlcpcb.com/partdetail/C3845088; ComponentLink3Description: LCSC Part URL; ComponentLink3URL: https://lcsc.com/product-detail/Multilayer-Ceramic-Capacitors-MLCC---SMD-SMT_Walsin-Tech-Corp-Walsin-Tech-Corp-0603B224J160CT_C3845088.html
footprint CAP-0603 (0603 (1608M) Capacitor)
pins: 1, 2

## 0603B224J500NT
designator C?  Capacitance: 220nF  (hidden comment: *)
Capacitor, Ceramic (MLCC), 220nF, ±5%, 50V, X7R, ±5%, SMD 0603; Manufacturer: FH(Guangdong Fenghua Advanced Tech); Manufacturer Part Number: 0603B224J500NT; Package Size: 0603; JLCPCB Basic Part: No; JLCPCB Part Number: C164107; Supplier 1: LCSC; Category: Capacitors - MLCC; Supplier Part Number 1: C164107; Tolerance: ±5%; Voltage Rating: 50V; Temperature Coefficient: X7R; RoHS: Yes; ComponentLink1Description: Datasheet; ComponentLink1URL: https://wmsc.lcsc.com/wmsc/upload/file/pdf/v2/lcsc/2304140030_FH--Guangdong-Fenghua-Advanced-Tech-0603B224J500NT_C164107.pdf; ComponentLink2Description: JLCPCB Part URL; ComponentLink2URL: https://jlcpcb.com/partdetail/C164107; ComponentLink3Description: LCSC Part URL; ComponentLink3URL: https://lcsc.com/product-detail/Multilayer-Ceramic-Capacitors-MLCC---SMD-SMT_FH-Guangdong-Fenghua-Advanced-Tech-FH-Guangdong-Fenghua-Advanced-Tech-0603B224J500NT_C164107.html
footprint CAP-0603 (0603 (1608M) Capacitor)
pins: 1, 2

## 0603B224K100CT
designator C?  Capacitance: 220nF  (hidden comment: *)
Capacitor, Ceramic (MLCC), 220nF, ±10%, 10V, X7R, ±10%, SMD 0603; Manufacturer: Walsin Tech Corp; Manufacturer Part Number: 0603B224K100CT; Package Size: 0603; JLCPCB Basic Part: No; JLCPCB Part Number: C302022; Supplier 1: LCSC; Category: Capacitors - MLCC; Supplier Part Number 1: C302022; Tolerance: ±10%; Voltage Rating: 10V; Temperature Coefficient: X7R; RoHS: Yes; ComponentLink1Description: Datasheet; ComponentLink1URL: https://wmsc.lcsc.com/wmsc/upload/file/pdf/v2/lcsc/2304140030_Walsin-Tech-Corp-0603B224K100CT_C302022.pdf; ComponentLink2Description: JLCPCB Part URL; ComponentLink2URL: https://jlcpcb.com/partdetail/C302022; ComponentLink3Description: LCSC Part URL; ComponentLink3URL: https://lcsc.com/product-detail/Multilayer-Ceramic-Capacitors-MLCC---SMD-SMT_Walsin-Tech-Corp-Walsin-Tech-Corp-0603B224K100CT_C302022.html
footprint CAP-0603 (0603 (1608M) Capacitor)
pins: 1, 2

## 0603B224K160CT
designator C?  Capacitance: 220nF  (hidden comment: *)
Capacitor, Ceramic (MLCC), 220nF, ±10%, 16V, X7R, ±10%, SMD 0603; Manufacturer: Walsin Tech Corp; Manufacturer Part Number: 0603B224K160CT; Package Size: 0603; JLCPCB Basic Part: No; JLCPCB Part Number: C338153; Supplier 1: LCSC; Category: Capacitors - MLCC; Supplier Part Number 1: C338153; Tolerance: ±10%; Voltage Rating: 16V; Temperature Coefficient: X7R; RoHS: Yes; ComponentLink1Description: Datasheet; ComponentLink1URL: https://wmsc.lcsc.com/wmsc/upload/file/pdf/v2/lcsc/2304140030_Walsin-Tech-Corp-0603B224K160CT_C338153.pdf; ComponentLink2Description: JLCPCB Part URL; ComponentLink2URL: https://jlcpcb.com/partdetail/C338153; ComponentLink3Description: LCSC Part URL; ComponentLink3URL: https://lcsc.com/product-detail/Multilayer-Ceramic-Capacitors-MLCC---SMD-SMT_Walsin-Tech-Corp-Walsin-Tech-Corp-0603B224K160CT_C338153.html
footprint CAP-0603 (0603 (1608M) Capacitor)
pins: 1, 2

## 0603B224K160NT
designator C?  Capacitance: 220nF  (hidden comment: *)
Capacitor, Ceramic (MLCC), 220nF, ±10%, 16V, ±10%, SMD 0603; Manufacturer: FH(Guangdong Fenghua Advanced Tech); Manufacturer Part Number: 0603B224K160NT; Package Size: 0603; JLCPCB Basic Part: No; JLCPCB Part Number: C285136; Supplier 1: LCSC; Category: Capacitors - MLCC; Supplier Part Number 1: C285136; Tolerance: ±10%; Voltage Rating: 16V; RoHS: Yes; ComponentLink1Description: Datasheet; ComponentLink1URL: https://wmsc.lcsc.com/wmsc/upload/file/pdf/v2/lcsc/2304140030_FH--Guangdong-Fenghua-Advanced-Tech-0603B224K160NT_C285136.pdf; ComponentLink2Description: JLCPCB Part URL; ComponentLink2URL: https://jlcpcb.com/partdetail/C285136; ComponentLink3Description: LCSC Part URL; ComponentLink3URL: https://lcsc.com/product-detail/Multilayer-Ceramic-Capacitors-MLCC---SMD-SMT_FH-Guangdong-Fenghua-Advanced-Tech-FH-Guangdong-Fenghua-Advanced-Tech-0603B224K160NT_C285136.html
footprint CAP-0603 (0603 (1608M) Capacitor)
pins: 1, 2

## 0603B224K250CT
designator C?  Capacitance: 220nF  (hidden comment: *)
Capacitor, Ceramic (MLCC), 220nF, ±10%, 25V, X7R, ±10%, SMD 0603; Manufacturer: Walsin Tech Corp; Manufacturer Part Number: 0603B224K250CT; Package Size: 0603; JLCPCB Basic Part: No; JLCPCB Part Number: C335532; Supplier 1: LCSC; Category: Capacitors - MLCC; Supplier Part Number 1: C335532; Tolerance: ±10%; Voltage Rating: 25V; Temperature Coefficient: X7R; RoHS: Yes; ComponentLink1Description: Datasheet; ComponentLink1URL: https://wmsc.lcsc.com/wmsc/upload/file/pdf/v2/lcsc/2304140030_Walsin-Tech-Corp-0603B224K250CT_C335532.pdf; ComponentLink2Description: JLCPCB Part URL; ComponentLink2URL: https://jlcpcb.com/partdetail/C335532; ComponentLink3Description: LCSC Part URL; ComponentLink3URL: https://lcsc.com/product-detail/Multilayer-Ceramic-Capacitors-MLCC---SMD-SMT_Walsin-Tech-Corp-Walsin-Tech-Corp-0603B224K250CT_C335532.html
footprint CAP-0603 (0603 (1608M) Capacitor)
pins: 1, 2

## 0603B224K250NT
designator C?  Capacitance: 220nF  (hidden comment: *)
Capacitor, Ceramic (MLCC), 220nF, ±10%, 25V, X7R, ±10%, SMD 0603; Manufacturer: FH(Guangdong Fenghua Advanced Tech); Manufacturer Part Number: 0603B224K250NT; Package Size: 0603; JLCPCB Basic Part: No; JLCPCB Part Number: C1606; Supplier 1: LCSC; Category: Capacitors - MLCC; Supplier Part Number 1: C1606; Tolerance: ±10%; Voltage Rating: 25V; Temperature Coefficient: X7R; RoHS: Yes; ComponentLink1Description: Datasheet; ComponentLink1URL: https://wmsc.lcsc.com/wmsc/upload/file/pdf/v2/lcsc/2304140030_FH--Guangdong-Fenghua-Advanced-Tech-0603B224K250NT_C1606.pdf; ComponentLink2Description: JLCPCB Part URL; ComponentLink2URL: https://jlcpcb.com/partdetail/C1606; ComponentLink3Description: LCSC Part URL; ComponentLink3URL: https://lcsc.com/product-detail/Multilayer-Ceramic-Capacitors-MLCC---SMD-SMT_FH-Guangdong-Fenghua-Advanced-Tech-FH-Guangdong-Fenghua-Advanced-Tech-0603B224K250NT_C1606.html
footprint CAP-0603 (0603 (1608M) Capacitor)
pins: 1, 2

## 0603B224K500CT
designator C?  Capacitance: 220nF  (hidden comment: *)
Capacitor, Ceramic (MLCC), 220nF, ±10%, 50V, X7R, ±10%, SMD 0603; Manufacturer: Walsin Tech Corp; Manufacturer Part Number: 0603B224K500CT; Package Size: 0603; JLCPCB Basic Part: No; JLCPCB Part Number: C237192; Supplier 1: LCSC; Category: Capacitors - MLCC; Supplier Part Number 1: C237192; Tolerance: ±10%; Voltage Rating: 50V; Temperature Coefficient: X7R; RoHS: Yes; ComponentLink1Description: Datasheet; ComponentLink1URL: https://wmsc.lcsc.com/wmsc/upload/file/pdf/v2/lcsc/2304140030_Walsin-Tech-Corp-0603B224K500CT_C237192.pdf; ComponentLink2Description: JLCPCB Part URL; ComponentLink2URL: https://jlcpcb.com/partdetail/C237192; ComponentLink3Description: LCSC Part URL; ComponentLink3URL: https://lcsc.com/product-detail/Multilayer-Ceramic-Capacitors-MLCC---SMD-SMT_Walsin-Tech-Corp-Walsin-Tech-Corp-0603B224K500CT_C237192.html
footprint CAP-0603 (0603 (1608M) Capacitor)
pins: 1, 2

## 0603B224K500NT
designator C?  Capacitance: 220nF  (hidden comment: *)
Capacitor, Ceramic (MLCC), 220nF, ±10%, 50V, X7R, ±10%, SMD 0603; Manufacturer: FH(Guangdong Fenghua Advanced Tech); Manufacturer Part Number: 0603B224K500NT; Package Size: 0603; JLCPCB Basic Part: No; JLCPCB Part Number: C83626; Supplier 1: LCSC; Category: Capacitors - MLCC; Supplier Part Number 1: C83626; Tolerance: ±10%; Voltage Rating: 50V; Temperature Coefficient: X7R; RoHS: Yes; ComponentLink1Description: Datasheet; ComponentLink1URL: https://wmsc.lcsc.com/wmsc/upload/file/pdf/v2/lcsc/2304140030_FH--Guangdong-Fenghua-Advanced-Tech-0603B224K500NT_C83626.pdf; ComponentLink2Description: JLCPCB Part URL; ComponentLink2URL: https://jlcpcb.com/partdetail/C83626; ComponentLink3Description: LCSC Part URL; ComponentLink3URL: https://lcsc.com/product-detail/Multilayer-Ceramic-Capacitors-MLCC---SMD-SMT_FH-Guangdong-Fenghua-Advanced-Tech-FH-Guangdong-Fenghua-Advanced-Tech-0603B224K500NT_C83626.html
footprint CAP-0603 (0603 (1608M) Capacitor)
pins: 1, 2

## 0603B224M160CT
designator C?  Capacitance: 220nF  (hidden comment: *)
Capacitor, Ceramic (MLCC), 220nF, ±20%, 16V, X7R, ±20%, SMD 0603; Manufacturer: Walsin Tech Corp; Manufacturer Part Number: 0603B224M160CT; Package Size: 0603; JLCPCB Basic Part: No; JLCPCB Part Number: C2894190; Supplier 1: LCSC; Category: Capacitors - MLCC; Supplier Part Number 1: C2894190; Tolerance: ±20%; Voltage Rating: 16V; Temperature Coefficient: X7R; RoHS: Yes; ComponentLink1Description: Datasheet; ComponentLink1URL: https://wmsc.lcsc.com/wmsc/upload/file/pdf/v2/lcsc/2109081830_Walsin-Tech-Corp-0603B224M160CT_C2894190.pdf; ComponentLink2Description: JLCPCB Part URL; ComponentLink2URL: https://jlcpcb.com/partdetail/C2894190; ComponentLink3Description: LCSC Part URL; ComponentLink3URL: https://lcsc.com/product-detail/Multilayer-Ceramic-Capacitors-MLCC---SMD-SMT_Walsin-Tech-Corp-Walsin-Tech-Corp-0603B224M160CT_C2894190.html
footprint CAP-0603 (0603 (1608M) Capacitor)
pins: 1, 2

## 0603B225K6R3CT
designator C?  Capacitance: 2.2uF  (hidden comment: *)
Capacitor, Ceramic (MLCC), 2.2uF, ±10%, 6.3V, X7R, ±10%, SMD 0603; Manufacturer: Walsin Tech Corp; Manufacturer Part Number: 0603B225K6R3CT; Package Size: 0603; JLCPCB Basic Part: No; JLCPCB Part Number: C2840247; Supplier 1: LCSC; Category: Capacitors - MLCC; Supplier Part Number 1: C2840247; Tolerance: ±10%; Voltage Rating: 6.3V; Temperature Coefficient: X7R; RoHS: Yes; ComponentLink1Description: Datasheet; ComponentLink1URL: https://wmsc.lcsc.com/wmsc/upload/file/pdf/v2/lcsc/2207111830_Walsin-Tech-Corp-0603B225K6R3CT_C2840247.pdf; ComponentLink2Description: JLCPCB Part URL; ComponentLink2URL: https://jlcpcb.com/partdetail/C2840247; ComponentLink3Description: LCSC Part URL; ComponentLink3URL: https://lcsc.com/product-detail/Multilayer-Ceramic-Capacitors-MLCC---SMD-SMT_Walsin-Tech-Corp-Walsin-Tech-Corp-0603B225K6R3CT_C2840247.html
footprint CAP-0603 (0603 (1608M) Capacitor)
pins: 1, 2

## 0603B225K100CT
designator C?  Capacitance: 2.2uF  (hidden comment: *)
Capacitor, Ceramic (MLCC), 2.2uF, ±10%, 10V, X7R, ±10%, SMD 0603; Manufacturer: Walsin Tech Corp; Manufacturer Part Number: 0603B225K100CT; Package Size: 0603; JLCPCB Basic Part: No; JLCPCB Part Number: C388012; Supplier 1: LCSC; Category: Capacitors - MLCC; Supplier Part Number 1: C388012; Tolerance: ±10%; Voltage Rating: 10V; Temperature Coefficient: X7R; RoHS: Yes; ComponentLink1Description: Datasheet; ComponentLink1URL: https://wmsc.lcsc.com/wmsc/upload/file/pdf/v2/lcsc/2304140030_Walsin-Tech-Corp-0603B225K100CT_C388012.pdf; ComponentLink2Description: JLCPCB Part URL; ComponentLink2URL: https://jlcpcb.com/partdetail/C388012; ComponentLink3Description: LCSC Part URL; ComponentLink3URL: https://lcsc.com/product-detail/Multilayer-Ceramic-Capacitors-MLCC---SMD-SMT_Walsin-Tech-Corp-Walsin-Tech-Corp-0603B225K100CT_C388012.html
footprint CAP-0603 (0603 (1608M) Capacitor)
pins: 1, 2

## 0603B225K100NT
designator C?  Capacitance: 2.2uF  (hidden comment: *)
Capacitor, Ceramic (MLCC), 2.2uF, ±10%, 10V, X7R, ±10%, SMD 0603; Manufacturer: FH(Guangdong Fenghua Advanced Tech); Manufacturer Part Number: 0603B225K100NT; Package Size: 0603; JLCPCB Basic Part: No; JLCPCB Part Number: C165991; Supplier 1: LCSC; Category: Capacitors - MLCC; Supplier Part Number 1: C165991; Tolerance: ±10%; Voltage Rating: 10V; Temperature Coefficient: X7R; RoHS: Yes; ComponentLink1Description: Datasheet; ComponentLink1URL: https://wmsc.lcsc.com/wmsc/upload/file/pdf/v2/lcsc/2304140030_FH--Guangdong-Fenghua-Advanced-Tech-0603B225K100NT_C165991.pdf; ComponentLink2Description: JLCPCB Part URL; ComponentLink2URL: https://jlcpcb.com/partdetail/C165991; ComponentLink3Description: LCSC Part URL; ComponentLink3URL: https://lcsc.com/product-detail/Multilayer-Ceramic-Capacitors-MLCC---SMD-SMT_FH-Guangdong-Fenghua-Advanced-Tech-FH-Guangdong-Fenghua-Advanced-Tech-0603B225K100NT_C165991.html
footprint CAP-0603 (0603 (1608M) Capacitor)
pins: 1, 2

## 0603B225K160CT
designator C?  Capacitance: 2.2uF  (hidden comment: *)
Capacitor, Ceramic (MLCC), 2.2uF, ±10%, 16V, X7R, ±10%, SMD 0603; Manufacturer: Walsin Tech Corp; Manufacturer Part Number: 0603B225K160CT; Package Size: 0603; JLCPCB Basic Part: No; JLCPCB Part Number: C525501; Supplier 1: LCSC; Category: Capacitors - MLCC; Supplier Part Number 1: C525501; Tolerance: ±10%; Voltage Rating: 16V; Temperature Coefficient: X7R; RoHS: Yes; ComponentLink1Description: Datasheet; ComponentLink1URL: https://wmsc.lcsc.com/wmsc/upload/file/pdf/v2/lcsc/2304140030_Walsin-Tech-Corp-0603B225K160CT_C525501.pdf; ComponentLink2Description: JLCPCB Part URL; ComponentLink2URL: https://jlcpcb.com/partdetail/C525501; ComponentLink3Description: LCSC Part URL; ComponentLink3URL: https://lcsc.com/product-detail/Multilayer-Ceramic-Capacitors-MLCC---SMD-SMT_Walsin-Tech-Corp-Walsin-Tech-Corp-0603B225K160CT_C525501.html
footprint CAP-0603 (0603 (1608M) Capacitor)
pins: 1, 2